# Altium footprint library North POLE.PcbLib: 419 footprints (part 18 of 27)
Each footprint in its own frame and in the unit in brackets; x right, y up, seen from the top. Pads: shape width x height; smd on the part's side, far side on the other; paste and mask are expansions set on the pad; w line width, h text height; cw(c..) or ccw(c..) is an arc to the next point about the centre after c.
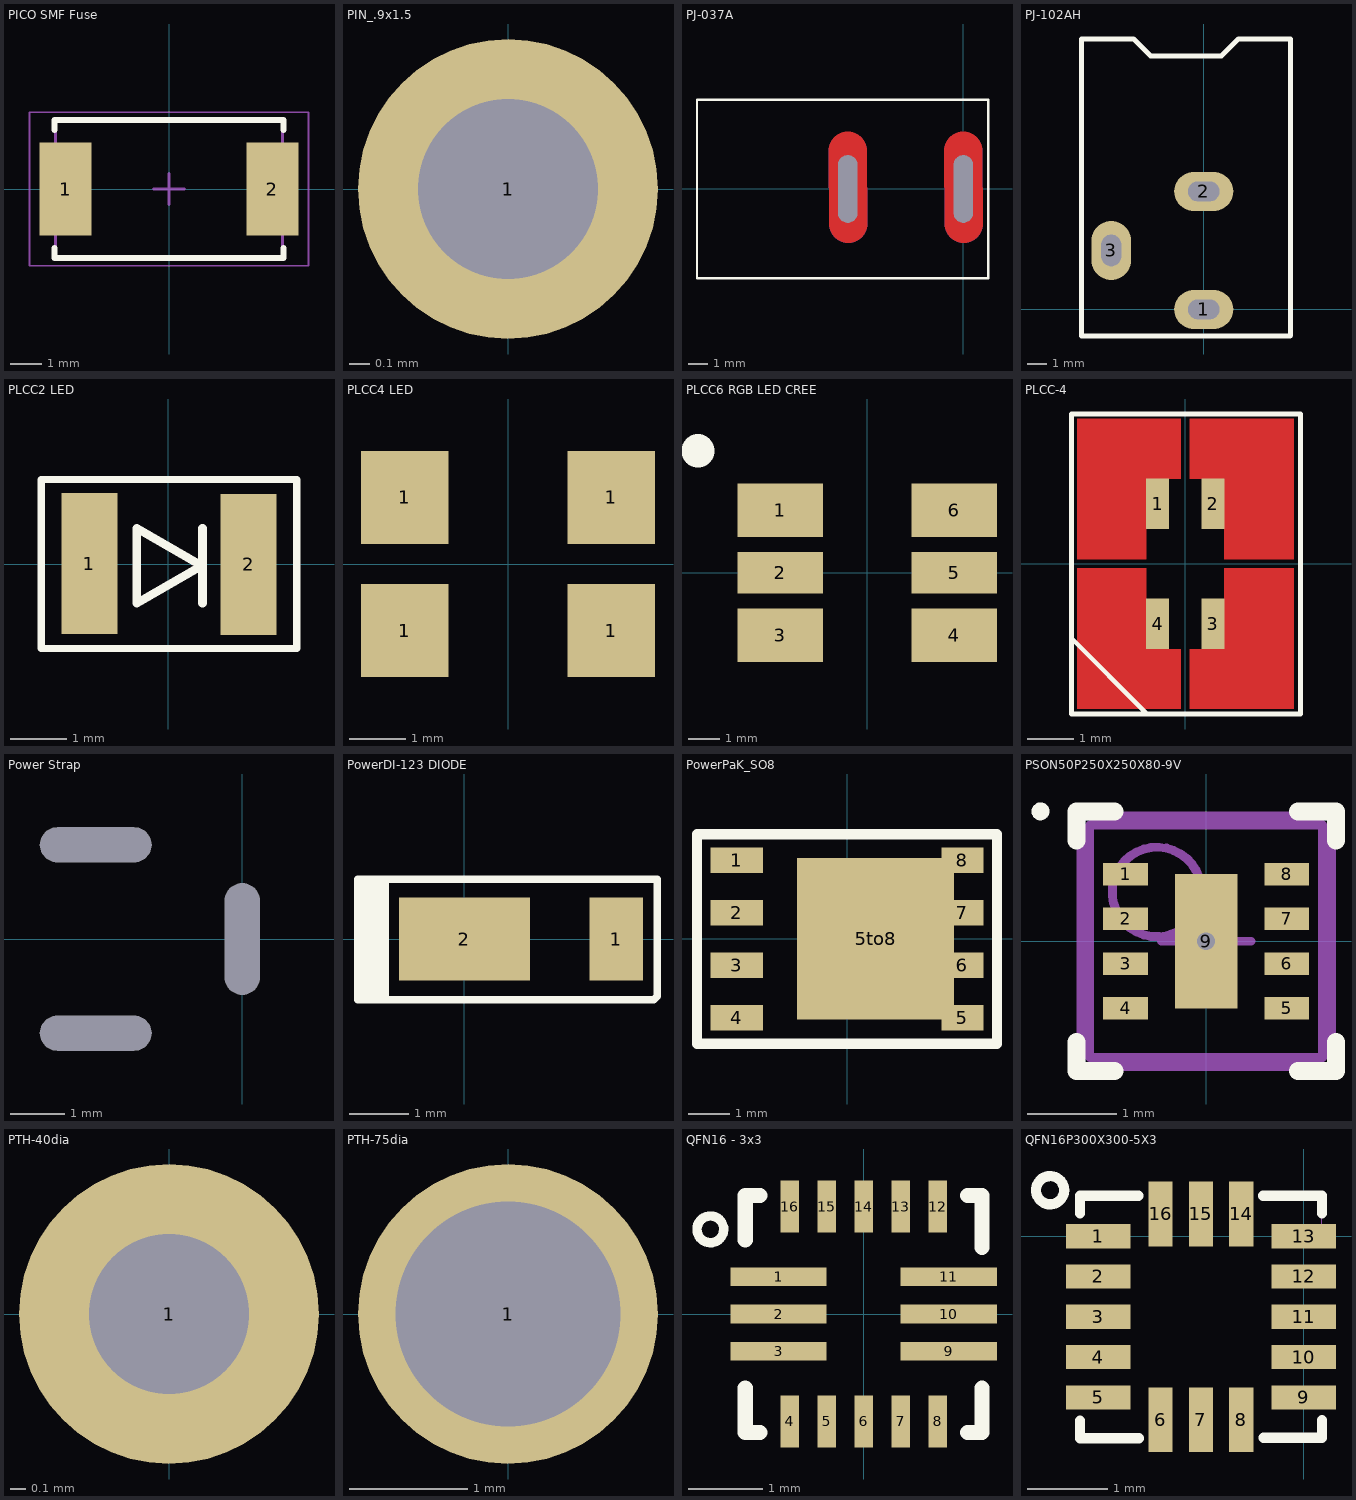
[diagram p17: the footprints below, top view; thin cyan lines are the x and y axes]

## PICO SMF Fuse [mm] "Littlefuse 460 Series"
height 3.05
pads (2):
  rect 1.65x2.97 smd: 1(-3.3,0) 2(3.3,0)
Top Overlay:
  lines w0.2: -3.65,-1.885 -3.65,-2.2 3.65,-2.2 3.65,-1.885 ; -3.65,1.885 -3.65,2.2 3.65,2.2 3.65,1.885
Mechanical 13:
  lines w0.1: -3.62,-2.16 -3.62,2.16 3.62,2.16 3.62,-2.16 -3.62,-2.16
Mechanical 15:
  lines w0.05: -4.45,-2.45 -4.45,2.45 4.45,2.45 4.45,-2.45 -4.45,-2.45
  lines w0.1: -0.5,0 0.5,0 ; 0,-0.5 0,0.5
3D body: height 3.05, standoff 0, extent -3.62,-2.16 3.62,2.16

## PIN_.9x1.5 [mm]
pads (1):
  round 1.5 hole 0.9: 1(0,0)

## PJ-037A [mm]
pads (2):
  rrect50% 0x0 hole 1 slot 3.5 at 90 deg mask+0.08: 1(0,0) 2(-6,0)
Top Layer:
  lines w2: -5.994,1.973 -5.967,-1.822 ; 0.006,1.973 0.033,-1.822
Bottom Layer:
  lines w2: -5.994,1.945 -5.967,-1.822 ; 0.006,1.945 0.033,-1.822
Top Overlay:
  lines w0.127: -13.833,-4.633 1.306,-4.633 1.306,4.625 -13.833,4.622 -13.833,-4.633
Top Solder:
  lines w2: -5.994,1.973 -5.967,-1.822 ; 0.006,1.973 0.033,-1.822
Bottom Solder:
  lines w2: -5.994,1.973 -5.967,-1.822 ; 0.006,1.973 0.033,-1.822
3D body: height 11, standoff -3.5, extent -13.702,-4.5 0.798,4.5

## PJ-102AH [mm] "2.1x5.5mm barrel power jack"
height 0.254
pads (3):
  oval 3x2 hole 1 slot 1.6 at 0 deg: 1(0,0) 2(0,5.994)
  oval 2x3 hole 1 slot 1.6 at 90 deg: 3(-4.699,2.997)
Top Overlay:
  lines w0.254: -6.223,-1.346 -6.223,13.741 -3.562,13.741 -2.699,12.878 0.895,12.878 1.759,13.741 4.42,13.741 4.42,-1.321 4.394,-1.346 -6.223,-1.346

## PLCC2 LED [mm]
pads (2):
  rect 1x2.5 smd mask+0.08: 1(-1.394,0.01) 2(1.425,-0.003)
Top Overlay:
  lines w0.127: -2.25,-1.492 -2.25,1.5 2.28,1.5 2.28,-1.492 -2.25,-1.492
  lines w0.152: 0.594,-0.028 -0.559,-0.694 -0.559,0.641 0.596,-0.026 ; 0.61,-0.694 0.61,0.641
3D body: height 1.86, standoff 0, extent -1.75,-1.403 1.75,1.397

## PLCC4 LED [mm]
pads (4):
  rect 1.55x1.65 smd: 1(-1.825,-1.175) 1(-1.825,1.175) 1(1.825,-1.175) 1(1.825,1.175)
3D body: height 1.95, standoff 0, extent -1.75,-1.4 1.75,1.4

## PLCC6 RGB LED CREE [mm]
pads (6):
  rect 2.7x1.7 smd mask+0.08: 1(-2.75,1.975) 3(-2.75,-1.975) 4(2.75,-1.975) 6(2.75,1.975)
  rect 2.7x1.3 smd mask+0.08: 2(-2.75,0) 5(2.75,0)
Top Overlay:
  lines w1: -5.356,3.881 ccw(c-5.359,3.856) -5.334,3.861
3D body: height 2.7, standoff 0.1, extent -2.75,-2.75 2.75,2.75

## PLCC-4 [mm] "PLCC-4 SMT LED"
pads (4):
  rect 0.5x1.1 smd: 1(-0.6,1.3) 2(0.6,1.3) 3(0.6,-1.3) 4(-0.6,-1.3)
Top Layer:
  region: 0.1,1.85 0.1,3.15 2.35,3.15 2.35,0.1 0.85,0.1 0.85,1.85
  region: -0.1,1.85 -0.1,3.15 -2.35,3.15 -2.35,0.1 -0.85,0.1 -0.85,1.85
  region: 0.1,-1.85 0.1,-3.15 2.35,-3.15 2.35,-0.1 0.85,-0.1 0.85,-1.85
  region: -0.1,-1.85 -0.1,-3.15 -2.35,-3.15 -2.35,-0.1 -0.85,-0.1 -0.85,-1.85
Top Overlay:
  lines w0.1: -2.47,-1.62 -0.86,-3.23 ; -2.47,-3.26 -2.47,3.25 2.5,3.25 2.5,-3.26 -2.47,-3.26

## Power Strap [mil]
pads (3):
  round 0 hole 25 slot 80 at 0 deg mask+3.15: 1(-105,67.5) 3(-105,-67.5)
  round 0 hole 25 slot 80 at 90 deg mask+3.15: 2(0,0)
Top Solder:
  lines w60: -132.56,-67.5 -76.46,-67.5 ; -132.56,67.5 -76.46,67.5 ; 0,-28.54 0,27.56
Bottom Solder:
  lines w60: -132.56,-67 -76.46,-67 ; -132.56,68 -76.46,68 ; -0.5,-27.56 -0.5,28.54

## PowerDI-123 DIODE [mm]
pads (2):
  rect 0.9x1.4 smd mask+0.08: 1(2.55,0)
  rect 2.2x1.4 smd mask+0.08: 2(0,0)
Top Overlay:
  rectangle: -1.788,-1.019 -1.331,0.95
  lines w0.127: -1.331,-1.019 -1.331,1.006 ; -1.788,-1.019 3.178,-1.019 3.238,-0.958 3.238,1.006 -1.788,1.006 -1.788,-1.019
3D body: height 1, standoff 0, extent -0.436,-0.916 2.381,0.895

## PowerPaK_SO8 [mm]
pads (9):
  rect 1.27x0.61 smd: 1(-2.67,1.9) 2(-2.67,0.63) 3(-2.67,-0.64) 4(-2.67,-1.91)
  rect 1.02x0.61 smd: 5(2.791,-1.91) 6(2.791,-0.64) 7(2.791,0.63) 8(2.791,1.9)
  rect 3.81x3.91 smd: 5to8(0.69,0)
Top Overlay:
  lines w0.254: -3.63,-2.545 3.63,-2.545 3.63,2.535 -3.63,2.535 -3.63,-2.545
3D body: height 1.12, standoff 0, extent -3.63,-2.545 3.63,2.535

## PSON50P250X250X80-9V [mm]
pads (9):
  rect 0.5x0.25 smd paste-0.125 mask+0.051: 1(-0.9,0.75) 2(-0.9,0.25) 3(-0.9,-0.25) 4(-0.9,-0.75) 5(0.9,-0.75) 6(0.9,-0.25) 7(0.9,0.25) 8(0.9,0.75)
  rect 0.7x1.5 smd paste-0.35 mask+0.051: 9(0,0)
via 0,0 diameter 0.5 hole 0.2
Top Overlay:
  circle w0.1: c-1.85,1.45 r0.05
  lines w0.2: -1.45,-1.125 -1.45,-1.45 -1.025,-1.45 ; -1.45,1.125 -1.45,1.45 -1.025,1.45 ; 1.025,-1.45 1.45,-1.45 1.45,-1.125 ; 1.025,1.45 1.45,1.45 1.45,1.125
Top Paste:
  region: -0.75,0.875 -1.25,0.875 -1.25,0.625 -0.75,0.625
  region: -0.75,0.375 -1.25,0.375 -1.25,0.125 -0.75,0.125
  region: -0.75,-0.125 -1.25,-0.125 -1.25,-0.375 -0.75,-0.375
  region: -0.75,-0.625 -1.25,-0.625 -1.25,-0.875 -0.75,-0.875
  rectangle: 0.75,-0.875 1.25,-0.625
  rectangle: 0.75,-0.375 1.25,-0.125
  rectangle: 0.75,0.125 1.25,0.375
  rectangle: 0.75,0.625 1.25,0.875
  rectangle: -0.333,-0.713 0.333,0.713
Mechanical 13:
  circle w0.1: c-0.55,0.55 r0.5
  lines w0.1: -1.3,-1.3 1.3,-1.3 1.3,1.3 -1.3,1.3 -1.3,-1.3
Mechanical 15:
  lines w0.1: -0.5,0 0.5,0 ; 0,-0.5 0,0.5 ; -1.4,-1.4 1.4,-1.4 1.4,1.4 -1.4,1.4 -1.4,-1.4
3D body: height 0.8, standoff 0, extent -1.299,-1.299 1.299,1.299

## PTH-40dia [mil]
pads (1):
  round 75 hole 40 mask+3.15: 1(0,0)

## PTH-75dia [mm]
pads (1):
  round 2.54 hole 1.905 mask+0.08: 1(0,0)

## QFN16 - 3x3 [mm]
pads (16):
  rect 1.3x0.25 smd: 1(-1.15,0.5) 2(-1.15,0) 3(-1.15,-0.5) 9(1.15,-0.5) 10(1.15,0) 11(1.15,0.5)
  rect 0.25x0.7 smd: 4(-1,-1.45) 5(-0.5,-1.45) 6(0,-1.45) 7(0.5,-1.45) 8(1,-1.45) 12(1,1.45) 13(0.5,1.45) 14(0,1.45) 15(-0.5,1.45) 16(-1,1.45)
Top Overlay:
  lines w0.127: -1.913,1.231 ccw(c-2.071,1.143) -1.9,1.2
  lines w0.203: -1.6,-1 -1.6,-1.6 -1.4,-1.6 ; -1.6,1 -1.6,1.6 -1.4,1.6 ; 1.4,-1.6 1.6,-1.6 1.6,-1 ; 1.4,1.6 1.6,1.6 1.6,0.9
3D body: height 1, standoff 0, extent -1.6,-1.6 1.6,1.6

## QFN16P300X300-5X3 [mm] "16 qfn with 5x3x5x3 pin pattern"
pads (16):
  rect 0.8x0.3 smd paste-0.015 mask+0.113: 1(-2.55,0) 2(-2.55,-0.5) 3(-2.55,-1) 4(-2.55,-1.5) 5(-2.55,-2) 9(0,-2) 10(0,-1.5) 11(0,-1) 12(0,-0.5) 13(0,0)
  rect 0.3x0.8 smd paste-0.015 mask+0.113: 6(-1.775,-2.275) 7(-1.275,-2.275) 8(-0.775,-2.275) 14(-0.775,0.275) 15(-1.275,0.275) 16(-1.775,0.275)
Top Overlay:
  circle w0.127: c-3.145,0.57 r0.175
  lines w0.01: 0.225,0.495 0.225,0.5
  lines w0.127: -2.775,-2.505 -2.045,-2.505 ; -2.775,-2.5 -2.775,-2.285 ; -2.775,0.28 -2.775,0.5 -2.05,0.5 ; -0.505,0.5 0.225,0.5 ; -0.5,-2.5 0.225,-2.5 0.225,-2.28 ; 0.225,0.28 0.225,0.495
Mechanical 1:
  lines w0.01: 0.225,0 0.225,0.5
3D body: height 1, standoff 0, extent -2.775,-2.505 0.225,0.5